# Altium footprint library WE Inductors.PcbLib: 131 footprints (part 8 of 9)
Each footprint in its own frame and in the unit in brackets; x right, y up, seen from the top. Pads: shape width x height; smd on the part's side, far side on the other; paste and mask are expansions set on the pad; w line width, h text height; cw(c..) or ccw(c..) is an arc to the next point about the centre after c.
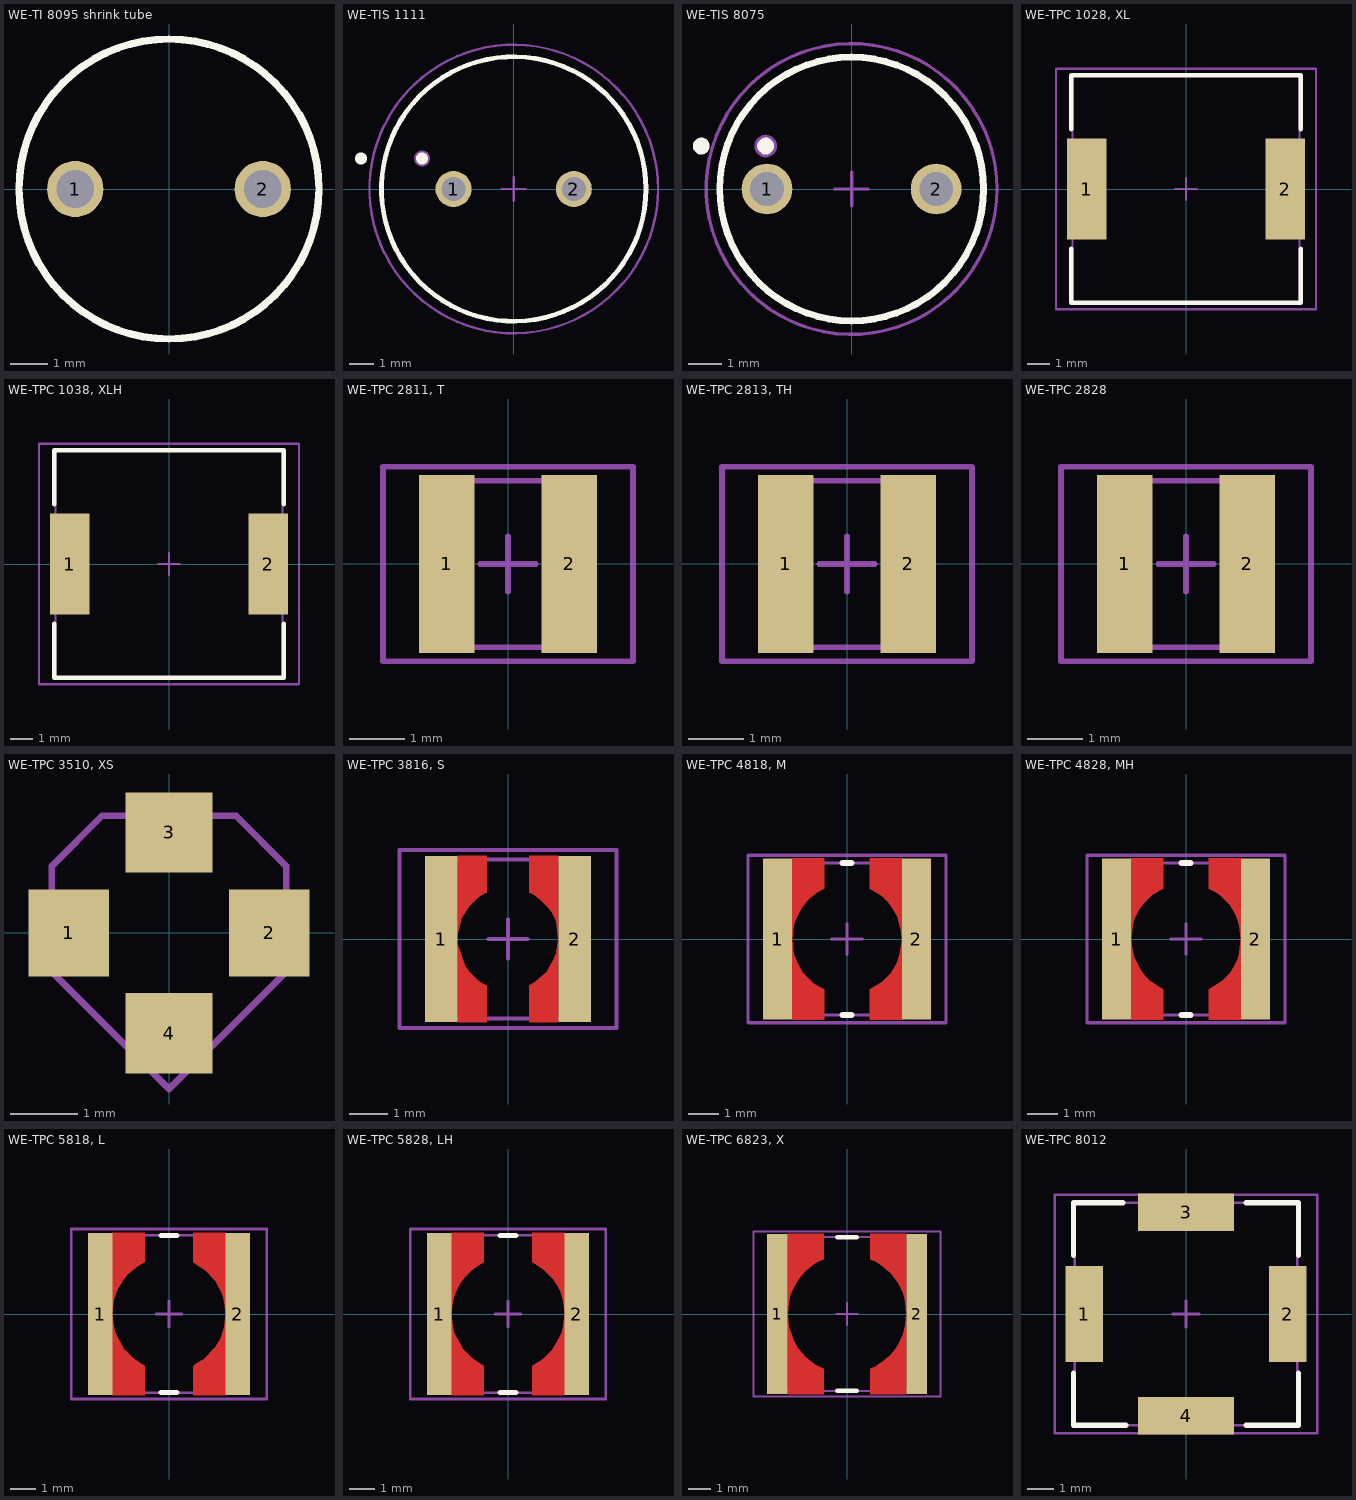
[diagram p7: the footprints below, top view; thin cyan lines are the x and y axes]

## WE-TI 8095 shrink tube [mm] "THT Inductor, 2-Leads, Body 8,0  mm"
height 9.5
pads (2):
  round 1.5 hole 1: 1(-2.5,0) 2(2.5,0)
Top Overlay:
  circle w0.2: c0,0 r4
Mechanical 1:
  circle w0.1: c0,0 r4
3D body: height 9.7, standoff -5, extent -5.77,-5.769 5.793,5.793

## WE-TIS 1111 [mm] "THT, 2-Leads, Body 11,0x11,0mm, Pitch 5mm"
height 11.5
pads (2):
  round 1.5 hole 1: 1(-2.5,0) 2(2.5,0)
Top Overlay:
  circle w0.25: c-6.35,1.27 r0.125
  circle w0.2: c0,0 r5.5
  circle w0.25: c-3.81,1.27 r0.125
Mechanical 13:
  circle w0.1: c0,0 r5.5
  circle w0.1: c-3.81,1.27 r0.284
Mechanical 15:
  circle w0.1: c0,0 r6
  lines w0.1: -0.5,0 0.5,0 ; 0,-0.5 0,0.5
3D body: height 10.5, standoff -3.5, extent -7.461,-7.495 7.529,7.495

## WE-TIS 8075 [mm] "THT, 2-Leads, Body 7,80x7,80mm, Pitch 5mm"
height 7.5
pads (2):
  round 1.5 hole 1: 1(-2.5,0) 2(2.5,0)
Top Overlay:
  circle w0.25: c-2.54,1.27 r0.125
  circle w0.25: c-4.445,1.27 r0.125
  circle w0.2: c0,0 r3.9
Mechanical 13:
  circle w0.1: c0,0 r3.9
  circle w0.1: c-2.54,1.27 r0.284
Mechanical 15:
  circle w0.1: c0,0 r4.297
  lines w0.1: -0.5,0 0.5,0 ; 0,-0.5 0,0.5
3D body: height 7.5, standoff -5, extent -5.515,-5.516 5.515,5.515

## WE-TPC 1028, XL [mm] "SMD Inductor, 2-Leads, Body 10,0x10,0mm"
height 3.1
pads (2):
  rect 1.8x4.6 smd: 1(-4.5,0) 2(4.5,0)
Top Overlay:
  lines w0.2: -5.2,-2.7 -5.2,-5.15 5.2,-5.15 5.2,-2.7 ; -5.2,2.7 -5.2,5.15 5.2,5.15 5.2,2.7
Mechanical 13:
  lines w0.1: -5.15,-5.15 -5.15,5.15 5.15,5.15 5.15,-5.15 -5.15,-5.15
Mechanical 15:
  lines w0.1: -0.5,0 0.5,0 ; 0,-0.5 0,0.5 ; -5.9,-5.45 -5.9,5.45 5.9,5.45 5.9,-5.45 -5.9,-5.45
3D body: height 2.75, standoff -0.03, extent -5,-5 5,5

## WE-TPC 1038, XLH [mm] "SMD Inductor, 2-Leads, Body 10,0x10,0mm"
height 4.1
pads (2):
  rect 1.8x4.6 smd: 1(-4.5,0) 2(4.5,0)
Top Overlay:
  lines w0.2: -5.2,-2.7 -5.2,-5.15 5.2,-5.15 5.2,-2.7 ; -5.2,2.7 -5.2,5.15 5.2,5.15 5.2,2.7
Mechanical 13:
  lines w0.1: -5.15,-5.15 -5.15,5.15 5.15,5.15 5.15,-5.15 -5.15,-5.15
Mechanical 15:
  lines w0.1: -0.5,0 0.5,0 ; 0,-0.5 0,0.5 ; -5.9,-5.45 -5.9,5.45 5.9,5.45 5.9,-5.45 -5.9,-5.45
3D body: height 3.75, standoff -0.05, extent -5,-4.8 5,5.2

## WE-TPC 2811, T [mm] "SMD Inductor, 2-Leads, Body 2,8x2,8mm"
height 1.2
pads (2):
  rect 1x3.2 smd: 1(-1.1,0) 2(1.1,0)
Mechanical 13:
  lines w0.1: -1.5,-1.5 -1.5,1.5 1.5,1.5 1.5,-1.5 -1.5,-1.5
Mechanical 15:
  lines w0.1: -0.5,0 0.5,0 ; 0,-0.5 0,0.5 ; -2.25,-1.75 -2.25,1.75 2.25,1.75 2.25,-1.75 -2.25,-1.75
3D body: height 1.15, standoff -0.01, extent -1.39,-1.39 1.39,1.39

## WE-TPC 2813, TH [mm] "SMD Inductor, 2-Leads, Body 2,8x2,8mm"
height 1.5
pads (2):
  rect 1x3.2 smd: 1(-1.1,0) 2(1.1,0)
Mechanical 13:
  lines w0.1: -1.5,-1.5 -1.5,1.5 1.5,1.5 1.5,-1.5 -1.5,-1.5
Mechanical 15:
  lines w0.1: -0.5,0 0.5,0 ; 0,-0.5 0,0.5 ; -2.25,-1.75 -2.25,1.75 2.25,1.75 2.25,-1.75 -2.25,-1.75
3D body: height 1.15, standoff -0.01, extent -1.38,-1.39 1.4,1.39

## WE-TPC 2828 [mm] "SMD Inductor, 2-Leads, Body 2,8x2,8mm"
height 3
pads (2):
  rect 1x3.2 smd: 1(-1.1,0) 2(1.1,0)
Mechanical 13:
  lines w0.1: -1.5,-1.5 1.5,-1.5 1.5,1.5 -1.5,1.5 -1.5,-1.5
Mechanical 15:
  lines w0.1: -0.5,0 0.5,0 ; 0,-0.5 0,0.5 ; -2.25,-1.75 2.25,-1.75 2.25,1.75 -2.25,1.75 -2.25,-1.75
3D body: height 2.79, standoff -0.01, extent -1.4,-1.4 1.4,1.4

## WE-TPC 3510, XS [mm] "SMD Inductor, 2-Leads, Body 3,3x3,5mm"
height 1.05
pads (4):
  rect 1.2x1.3 smd: 1(-1.5,0) 2(1.5,0)
  rect 1.3x1.2 smd: 3(0,1.5) 4(0,-1.5)
Mechanical 1:
  lines w0.1: -1.75,-0.583 -1.75,1 -1,1.75 1,1.75 1.75,1 1.75,-0.583 0,-2.333 -1.733,-0.6
3D body: height 0.93, standoff -0.02, extent -2.333,-2.333 2.334,2.333

## WE-TPC 3816, S [mm] "SMD Inductor, 2-Leads, Body 3,8x3,8mm"
height 1.8
pads (2):
  rect 0.85x4.3 smd: 1(-1.725,0) 2(1.725,0)
Top Layer:
  region: 1.3,-2.15 0.55,-2.15 0.55,-1.2 0.7,-1.1 1,-0.85 1.2,-0.5 1.25,-0.35 1.301,0
  region: 1.3,2.15 0.55,2.15 0.55,1.2 0.65,1.15 0.85,1 1.05,0.8 1.15,0.65 1.25,0.45 1.301,0
  region: -1.3,-2.15 -0.55,-2.15 -0.55,-1.2 -0.65,-1.15 -0.8,-1.05 -1,-0.85 -1.1,-0.7 -1.2,-0.45 -1.3,-0.15
  region: -1.3,2.15 -0.55,2.15 -0.55,1.2 -0.65,1.15 -0.8,1.05 -1,0.85 -1.2,0.55 -1.3,0.15
Mechanical 13:
  lines w0.1: -2.05,-2.05 2.05,-2.05 2.05,2.05 -2.05,2.05 -2.05,-2.05
Mechanical 15:
  lines w0.1: -0.5,0 0.5,0 ; 0,-0.5 0,0.5 ; -2.8,-2.3 2.8,-2.3 2.8,2.3 -2.8,2.3 -2.8,-2.3
3D body: height 1.64, standoff -0.01, extent -1.9,-1.9 1.9,1.9

## WE-TPC 4818, M [mm] "SMD Inductor, 2-Leads, Body 4,8x4,8mm"
height 2
pads (2):
  rect 0.95x5.3 smd: 1(-2.275,0) 2(2.275,0)
Top Layer:
  region: 1.8,-2.65 0.75,-2.65 0.75,-1.65 1,-1.5 1.15,-1.4 1.45,-1.1 1.55,-0.95 1.65,-0.75 1.7,-0.6 1.75,-0.4 1.8,0
  region: -1.8,-2.65 -0.75,-2.65 -0.75,-1.65 -0.95,-1.55 -1.1,-1.45 -1.45,-1.1 -1.6,-0.85 -1.75,-0.5 -1.8,0
  region: 1.8,2.65 0.75,2.65 0.75,1.65 1.15,1.4 1.35,1.2 1.5,1 1.65,0.75 1.771,0.314 1.8,0
  region: -1.8,2.65 -0.75,2.65 -0.75,1.65 -0.95,1.55 -1.2,1.35 -1.3,1.25 -1.5,1 -1.6,0.8 -1.7,0.6 -1.75,0.45 -1.8,0
Top Overlay:
  lines w0.2: -0.15,-2.5 0.15,-2.5 ; -0.15,2.5 0.15,2.5
Mechanical 13:
  lines w0.1: -2.5,-2.5 -2.5,2.5 2.5,2.5 2.5,-2.5 -2.5,-2.5
Mechanical 15:
  lines w0.1: -0.5,0 0.5,0 ; 0,-0.5 0,0.5 ; -3.25,-2.75 -3.25,2.75 3.25,2.75 3.25,-2.75 -3.25,-2.75
3D body: height 1.79, standoff -0.01, extent -2.4,-2.4 2.4,2.4

## WE-TPC 4828, MH [mm] "SMD Inductor, 2-Leads, Body 4,8x4,8mm"
height 3
pads (2):
  rect 0.95x5.3 smd: 1(-2.275,0) 2(2.275,0)
Top Layer:
  region: -1.8,2.65 -0.75,2.65 -0.75,1.65 -0.85,1.6 -1.1,1.45 -1.4,1.15 -1.55,0.95 -1.7,0.65 -1.75,0.45 -1.8,0
  region: 1.8,2.65 0.75,2.65 0.75,1.65 0.95,1.55 1.1,1.45 1.45,1.1 1.6,0.85 1.65,0.75 1.75,0.45 1.8,0
  region: 1.8,-2.65 0.75,-2.65 0.75,-1.65 1,-1.5 1.2,-1.35 1.45,-1.1 1.55,-0.95 1.7,-0.65 1.75,-0.45 1.8,0
  region: -1.8,-2.65 -0.75,-2.65 -0.75,-1.65 -1,-1.5 -1.2,-1.35 -1.35,-1.2 -1.5,-1 -1.65,-0.7 -1.7,-0.6 -1.75,-0.4 -1.8,0
Top Overlay:
  lines w0.2: -0.15,-2.5 0.15,-2.5 ; -0.15,2.5 0.15,2.5
Mechanical 13:
  lines w0.1: -2.5,-2.5 2.5,-2.5 2.5,2.5 -2.5,2.5 -2.5,-2.5
Mechanical 15:
  lines w0.1: -0.5,0 0.5,0 ; 0,-0.5 0,0.5 ; -3.25,-2.75 3.25,-2.75 3.25,2.75 -3.25,2.75 -3.25,-2.75
3D body: height 2.79, standoff -0.01, extent -2.4,-2.4 2.4,2.4

## WE-TPC 5818, L [mm] "SMD Inductor, 2-Leads, Body 5,8x5,8mm"
height 2
pads (2):
  rect 0.95x6.3 smd: 1(-2.675,0) 2(2.675,0)
Top Layer:
  region: 2.2,-3.15 0.95,-3.15 0.95,-2 1.1,-1.9 1.35,-1.75 1.8,-1.3 2,-0.95 2.15,-0.5 2.2,0
  region: -2.2,-3.15 -0.95,-3.15 -0.95,-2 -1.2,-1.85 -1.4,-1.7 -1.75,-1.35 -1.9,-1.1 -2.05,-0.8 -2.15,-0.5 -2.2,0
  region: 2.2,3.15 0.95,3.15 0.95,2 1.1,1.9 1.4,1.7 1.8,1.3 1.9,1.1 2,0.9 2.1,0.65 2.15,0.45 2.2,0
  region: -2.2,3.15 -0.95,3.15 -0.95,2 -1.15,1.9 -1.3,1.8 -1.6,1.55 -1.75,1.35 -1.8,1.3 -2,0.95 -2.15,0.55 -2.2,0
Top Overlay:
  lines w0.2: -0.3,-3.05 0.3,-3.05 ; -0.3,3.05 0.3,3.05
Mechanical 13:
  lines w0.1: -3.05,-3.05 -3.05,3.05 3.05,3.05 3.05,-3.05 -3.05,-3.05
Mechanical 15:
  lines w0.1: -0.5,0 0.5,0 ; 0,-0.5 0,0.5 ; -3.8,-3.3 -3.8,3.3 3.8,3.3 3.8,-3.3 -3.8,-3.3
3D body: height 1.79, standoff -0.01, extent -2.9,-2.9 2.9,2.9

## WE-TPC 5828, LH [mm] "SMD Inductor, 2-Leads, Body 5,8x5,8mm"
height 3
pads (2):
  rect 0.95x6.3 smd: 1(-2.675,0) 2(2.675,0)
Top Layer:
  region: -2.2,-3.15 -0.95,-3.15 -0.95,-2 -1.2,-1.85 -1.4,-1.7 -1.75,-1.35 -1.9,-1.1 -2.1,-0.7 -2.15,-0.45 -2.2,0
  region: 2.2,-3.15 0.95,-3.15 0.95,-2 1.35,-1.75 1.6,-1.5 1.7,-1.4 1.9,-1.1 2.05,-0.8 2.1,-0.65 2.15,-0.45 2.2,0
  region: 2.2,3.15 0.95,3.15 0.95,2 1.2,1.85 1.4,1.7 1.75,1.35 1.95,1.05 2.05,0.85 2.15,0.5 2.2,0
  region: -2.2,3.15 -0.95,3.15 -0.95,2 -1.2,1.85 -1.4,1.7 -1.7,1.4 -1.85,1.2 -2.05,0.8 -2.15,0.45 -2.2,0
Top Overlay:
  lines w0.2: -0.3,-3.05 0.3,-3.05 ; -0.3,3.05 0.3,3.05
Mechanical 13:
  lines w0.1: -3.05,-3.05 3.05,-3.05 3.05,3.05 -3.05,3.05 -3.05,-3.05
Mechanical 15:
  lines w0.1: -0.5,0 0.5,0 ; 0,-0.5 0,0.5 ; -3.8,-3.3 3.8,-3.3 3.8,3.3 -3.8,3.3 -3.8,-3.3
3D body: height 2.79, standoff -0.01, extent -2.9,-2.9 2.9,2.9

## WE-TPC 6823, X [mm] "SMD Inductor, 2-Leads, Body 6,8x6,8mm"
height 2.5
pads (2):
  rect 0.95x7.3 smd: 1(-3.175,0) 2(3.175,0)
Top Layer:
  region: -2.7,-3.65 -1.05,-3.65 -1.05,-2.5 -1.45,-2.3 -1.65,-2.15 -1.9,-1.95 -2.2,-1.6 -2.35,-1.35 -2.45,-1.15 -2.65,-0.55 -2.7,0
  region: 2.7,-3.65 1.05,-3.65 1.05,-2.5 1.35,-2.35 1.7,-2.1 1.95,-1.9 2,-1.85 2.2,-1.6 2.35,-1.35 2.45,-1.15 2.55,-0.9 2.6,-0.7 2.65,-0.5 2.7,0
  region: 2.7,3.65 1.05,3.65 1.05,2.5 1.35,2.35 1.65,2.15 2,1.85 2.3,1.45 2.55,0.95 2.65,0.55 2.7,0
  region: -2.7,3.65 -1.05,3.65 -1.05,2.5 -1.45,2.3 -1.6,2.2 -1.9,1.95 -2.2,1.6 -2.4,1.25 -2.55,0.95 -2.6,0.75 -2.65,0.5 -2.7,0
Top Overlay:
  lines w0.2: -0.45,-3.5 0.45,-3.5 ; -0.45,3.5 0.45,3.5
Mechanical 13:
  lines w0.1: -3.5,-3.5 3.5,-3.5 3.5,3.5 -3.5,3.5 -3.5,-3.5
Mechanical 15:
  lines w0.1: -0.5,0 0.5,0 ; 0,-0.5 0,0.5 ; -4.25,-3.75 4.25,-3.75 4.25,3.75 -4.25,3.75 -4.25,-3.75
3D body: height 2.29, standoff -0.01, extent -3.4,-3.4 3.4,3.4

## WE-TPC 8012 [mm] "SMD Inductor, 2-Leads, Body 8,0x8,0mm"
height 1.2
pads (4):
  rect 1.4x3.6 smd: 1(-3.8,0) 2(3.8,0)
  rect 3.6x1.4 smd: 3(0,3.8) 4(0,-3.8)
Top Overlay:
  lines w0.2: -4.2,-2.2 -4.2,-4.15 -2.25,-4.15 ; -4.2,2.2 -4.2,4.15 -2.35,4.15 ; 2.25,-4.15 4.2,-4.15 4.2,-2.2 ; 2.25,4.15 4.2,4.15 4.2,2.2
Mechanical 13:
  lines w0.1: -4.15,-4.15 4.15,-4.15 4.15,4.15 -4.15,4.15 -4.15,-4.15
Mechanical 15:
  lines w0.1: -0.5,0 0.5,0 ; 0,-0.5 0,0.5 ; -4.9,-4.45 4.9,-4.45 4.9,4.45 -4.9,4.45 -4.9,-4.45
3D body: height 1.09, standoff -0.01, extent -4,-4 4,4